# Altium footprint library WR-PHD_Socket Header.PcbLib: 273 footprints (part 12 of 18) (continued)
## 610110249221 [mm] "Socket Header, Pitch 2.54 mm, SMT, Angled, dual row, 10p" (continued)

## 610112249221 [mm] "Socket Header, Pitch 2.54 mm, SMT, Angled, dual row, 12p"
height 5.2
pads (14):
  rect 0.8x2.5 smd: 1(-6.35,6.76) 3(-3.81,6.76) 5(-1.27,6.76) 7(1.27,6.76) 9(3.81,6.76) 11(6.35,6.76)
  rect 0.8x2.1 smd: 2(-6.35,9.89) 4(-3.81,9.89) 6(-1.27,9.89) 8(1.27,9.89) 10(3.81,9.89) 12(6.35,9.89)
  round 1.4 hole 1.4 unplated: MH1(-5.08,2.75) MH2(5.08,2.75)
Top Overlay:
  lines w0.2: -8.12,-4.35 -8.12,4.35 8.12,4.35 8.12,-4.35 -8.12,-4.35
  text "11" at 7.21,6.3 h1.02
  text "12" at 7.21,9.4 h1.02
  text "2" at -7.91,9.4 h1.02
  text "1" at -7.61,6.3 h1.02
Top Designator:
  text ".Designator" at -7.498,-0.5 h1.5
Top Component Outline:
  lines w0.1: -6.67,4.25 -6.67,10.44 -6.03,10.44 -6.03,4.25 ; -6.67,7.49 -6.03,7.49 ; -4.13,4.25 -4.13,10.44 -3.49,10.44 -3.49,4.25 ; -4.13,7.49 -3.49,7.49 ; -1.59,4.25 -1.59,10.44 -0.95,10.44 -0.95,4.25 ; -1.59,7.49 -0.95,7.49 ; 0.95,4.25 0.95,10.44 1.59,10.44 1.59,4.25 ; 0.95,7.49 1.59,7.49 ; 3.49,4.25 3.49,10.44 4.13,10.44 4.13,4.25 ; 3.49,7.49 4.13,7.49 ; 6.03,4.25 6.03,10.44 6.67,10.44 6.67,4.25 ; 6.03,7.49 6.67,7.49 ; -7.87,-4.25 7.87,-4.25 7.87,4.25 -7.87,4.25 -7.87,-4.25
Top 3D Body:
  lines w0.1: -6.67,4.25 -6.67,10.44 -6.03,10.44 -6.03,4.25 ; -6.67,7.49 -6.03,7.49 ; -4.13,4.25 -4.13,10.44 -3.49,10.44 -3.49,4.25 ; -4.13,7.49 -3.49,7.49 ; -1.59,4.25 -1.59,10.44 -0.95,10.44 -0.95,4.25 ; -1.59,7.49 -0.95,7.49 ; 0.95,4.25 0.95,10.44 1.59,10.44 1.59,4.25 ; 0.95,7.49 1.59,7.49 ; 3.49,4.25 3.49,10.44 4.13,10.44 4.13,4.25 ; 3.49,7.49 4.13,7.49 ; 6.03,4.25 6.03,10.44 6.67,10.44 6.67,4.25 ; 6.03,7.49 6.67,7.49 ; -7.87,-4.25 7.87,-4.25 7.87,4.25 -7.87,4.25 -7.87,-4.25
Top Courtyard:
  lines w0.05: -0.5,0 0.5,0 ; 0,-0.5 0,0.5 ; -8.32,-4.55 8.32,-4.55 8.32,11.14 -8.32,11.14 -8.32,-4.55
3D body "610112249221.stp": height 5.03, standoff -1.27, extent -7.87,-4.25 7.87,10.44

## 610114249221 [mm] "Socket Header, Pitch 2.54 mm, SMT, Angled, dual row, 14p"
height 5.2
pads (16):
  rect 0.8x2.5 smd: 1(-7.62,6.76) 3(-5.08,6.76) 5(-2.54,6.76) 7(0,6.76) 9(2.54,6.76) 11(5.08,6.76) 13(7.62,6.76)
  rect 0.8x2.1 smd: 2(-7.62,9.89) 4(-5.08,9.89) 6(-2.54,9.89) 8(0,9.89) 10(2.54,9.89) 12(5.08,9.89) 14(7.62,9.89)
  round 1.4 hole 1.4 unplated: MH1(-6.35,2.75) MH2(6.35,2.75)
Top Overlay:
  lines w0.2: -9.39,-4.35 9.39,-4.35 9.39,4.35 -9.39,4.35 -9.39,-4.35
  text "14" at 8.48,9.4 h1.02
  text "13" at 8.48,6.3 h1.02
  text "1" at -8.88,6.3 h1.02
  text "2" at -9.18,9.4 h1.02
Top Designator:
  text ".Designator" at -7.498,-0.5 h1.5
Top Component Outline:
  lines w0.1: -7.94,4.25 -7.94,10.44 -7.3,10.44 -7.3,4.25 ; -7.94,7.49 -7.3,7.49 ; -5.4,4.25 -5.4,10.44 -4.76,10.44 -4.76,4.25 ; -5.4,7.49 -4.76,7.49 ; -2.86,4.25 -2.86,10.44 -2.22,10.44 -2.22,4.25 ; -2.86,7.49 -2.22,7.49 ; -0.32,4.25 -0.32,10.44 0.32,10.44 0.32,4.25 ; -0.32,7.49 0.32,7.49 ; 2.22,4.25 2.22,10.44 2.86,10.44 2.86,4.25 ; 2.22,7.49 2.86,7.49 ; 4.76,4.25 4.76,10.44 5.4,10.44 5.4,4.25 ; 4.76,7.49 5.4,7.49 ; 7.3,4.25 7.3,10.44 7.94,10.44 7.94,4.25 ; 7.3,7.49 7.94,7.49 ; -9.14,-4.25 9.14,-4.25 9.14,4.25 -9.14,4.25 -9.14,-4.25
Top 3D Body:
  lines w0.1: -7.94,4.25 -7.94,10.44 -7.3,10.44 -7.3,4.25 ; -7.94,7.49 -7.3,7.49 ; -5.4,4.25 -5.4,10.44 -4.76,10.44 -4.76,4.25 ; -5.4,7.49 -4.76,7.49 ; -2.86,4.25 -2.86,10.44 -2.22,10.44 -2.22,4.25 ; -2.86,7.49 -2.22,7.49 ; -0.32,4.25 -0.32,10.44 0.32,10.44 0.32,4.25 ; -0.32,7.49 0.32,7.49 ; 2.22,4.25 2.22,10.44 2.86,10.44 2.86,4.25 ; 2.22,7.49 2.86,7.49 ; 4.76,4.25 4.76,10.44 5.4,10.44 5.4,4.25 ; 4.76,7.49 5.4,7.49 ; 7.3,4.25 7.3,10.44 7.94,10.44 7.94,4.25 ; 7.3,7.49 7.94,7.49 ; -9.14,-4.25 -9.14,4.25 9.14,4.25 9.14,-4.25 -9.14,-4.25
Top Courtyard:
  lines w0.05: -0.5,0 0.5,0 ; 0,-0.5 0,0.5 ; -9.59,-4.55 -9.59,11.14 9.59,11.14 9.59,-4.55 -9.59,-4.55
3D body "610114249221.stp": height 5.03, standoff -1.27, extent -9.14,-4.25 9.14,10.44

## 610116249221 [mm] "Socket Header, Pitch 2.54 mm, SMT, Angled, dual row, 16p"
height 5.2
pads (18):
  rect 0.8x2.5 smd: 1(-8.89,6.76) 3(-6.35,6.76) 5(-3.81,6.76) 7(-1.27,6.76) 9(1.27,6.76) 11(3.81,6.76) 13(6.35,6.76) 15(8.89,6.76)
  rect 0.8x2.1 smd: 2(-8.89,9.89) 4(-6.35,9.89) 6(-3.81,9.89) 8(-1.27,9.89) 10(1.27,9.89) 12(3.81,9.89) 14(6.35,9.89) 16(8.89,9.89)
  round 1.4 hole 1.4 unplated: MH1(-7.62,2.75) MH2(7.62,2.75)
Top Overlay:
  lines w0.2: -10.66,-4.35 -10.66,4.35 10.66,4.35 10.66,-4.35 -10.66,-4.35
  text "2" at -10.45,9.4 h1.02
  text "1" at -10.15,6.3 h1.02
  text "16" at 9.75,9.4 h1.02
  text "15" at 9.75,6.3 h1.02
Top Designator:
  text ".Designator" at -7.498,-0.5 h1.5
Top Component Outline:
  lines w0.1: -9.21,4.25 -9.21,10.44 -8.57,10.44 -8.57,4.25 ; -9.21,7.49 -8.57,7.49 ; -6.67,4.25 -6.67,10.44 -6.03,10.44 -6.03,4.25 ; -6.67,7.49 -6.03,7.49 ; -4.13,4.25 -4.13,10.44 -3.49,10.44 -3.49,4.25 ; -4.13,7.49 -3.49,7.49 ; -1.59,4.25 -1.59,10.44 -0.95,10.44 -0.95,4.25 ; -1.59,7.49 -0.95,7.49 ; 0.95,4.25 0.95,10.44 1.59,10.44 1.59,4.25 ; 0.95,7.49 1.59,7.49 ; 3.49,4.25 3.49,10.44 4.13,10.44 4.13,4.25 ; 3.49,7.49 4.13,7.49 ; 6.03,4.25 6.03,10.44 6.67,10.44 6.67,4.25 ; 6.03,7.49 6.67,7.49 ; 8.57,4.25 8.57,10.44 9.21,10.44 9.21,4.25 ; 8.57,7.49 9.21,7.49 ; -10.41,-4.25 10.41,-4.25 10.41,4.25 -10.41,4.25 -10.41,-4.25
Top 3D Body:
  lines w0.1: -9.21,4.25 -9.21,10.44 -8.57,10.44 -8.57,4.25 ; -9.21,7.49 -8.57,7.49 ; -6.67,4.25 -6.67,10.44 -6.03,10.44 -6.03,4.25 ; -6.67,7.49 -6.03,7.49 ; -4.13,4.25 -4.13,10.44 -3.49,10.44 -3.49,4.25 ; -4.13,7.49 -3.49,7.49 ; -1.59,4.25 -1.59,10.44 -0.95,10.44 -0.95,4.25 ; -1.59,7.49 -0.95,7.49 ; 0.95,4.25 0.95,10.44 1.59,10.44 1.59,4.25 ; 0.95,7.49 1.59,7.49 ; 3.49,4.25 3.49,10.44 4.13,10.44 4.13,4.25 ; 3.49,7.49 4.13,7.49 ; 6.03,4.25 6.03,10.44 6.67,10.44 6.67,4.25 ; 6.03,7.49 6.67,7.49 ; 8.57,4.25 8.57,10.44 9.21,10.44 9.21,4.25 ; 8.57,7.49 9.21,7.49 ; -10.41,-4.25 10.41,-4.25 10.41,4.25 -10.41,4.25 -10.41,-4.25
Top Courtyard:
  lines w0.05: -0.5,0 0.5,0 ; 0,-0.5 0,0.5 ; -10.86,-4.55 10.86,-4.55 10.86,11.14 -10.86,11.14 -10.86,-4.55
3D body "610116249221.stp": height 5.03, standoff -1.27, extent -10.41,-4.25 10.41,10.44

## 610120249221 [mm] "Socket Header, Pitch 2.54 mm, SMT, Angled, dual row, 20p"
height 5.2
pads (22):
  rect 0.8x2.5 smd: 1(-11.43,6.76) 3(-8.89,6.76) 5(-6.35,6.76) 7(-3.81,6.76) 9(-1.27,6.76) 11(1.27,6.76) 13(3.81,6.76) 15(6.35,6.76) 17(8.89,6.76) 19(11.43,6.76)
  rect 0.8x2.1 smd: 2(-11.43,9.89) 4(-8.89,9.89) 6(-6.35,9.89) 8(-3.81,9.89) 10(-1.27,9.89) 12(1.27,9.89) 14(3.81,9.89) 16(6.35,9.89) 18(8.89,9.89) 20(11.43,9.89)
  round 1.4 hole 1.4 unplated: MH1(-10.16,2.75) MH2(10.16,2.75)
Top Overlay:
  lines w0.2: -13.2,-4.35 -13.2,4.35 13.2,4.35 13.2,-4.35 -13.2,-4.35
  text "19" at 12.29,6.3 h1.02
  text "20" at 12.29,9.4 h1.02
  text "2" at -12.99,9.4 h1.02
  text "1" at -12.69,6.3 h1.02
Top Designator:
  text ".Designator" at -7.498,-0.5 h1.5
Top Component Outline:
  lines w0.1: -11.75,4.25 -11.75,10.44 -11.11,10.44 -11.11,4.25 ; -11.75,7.49 -11.11,7.49 ; -9.21,4.25 -9.21,10.44 -8.57,10.44 -8.57,4.25 ; -9.21,7.49 -8.57,7.49 ; -6.67,4.25 -6.67,10.44 -6.03,10.44 -6.03,4.25 ; -6.67,7.49 -6.03,7.49 ; -4.13,4.25 -4.13,10.44 -3.49,10.44 -3.49,4.25 ; -4.13,7.49 -3.49,7.49 ; -1.59,4.25 -1.59,10.44 -0.95,10.44 -0.95,4.25 ; -1.59,7.49 -0.95,7.49 ; 0.95,4.25 0.95,10.44 1.59,10.44 1.59,4.25 ; 0.95,7.49 1.59,7.49 ; 3.49,4.25 3.49,10.44 4.13,10.44 4.13,4.25 ; 3.49,7.49 4.13,7.49 ; 6.03,4.25 6.03,10.44 6.67,10.44 6.67,4.25 ; 6.03,7.49 6.67,7.49 ; 8.57,4.25 8.57,10.44 9.21,10.44 9.21,4.25 ; 8.57,7.49 9.21,7.49 ; 11.11,4.25 11.11,10.44 11.75,10.44 11.75,4.25 ; 11.11,7.49 11.75,7.49 ; -12.95,-4.25 12.95,-4.25 12.95,4.25 -12.95,4.25 -12.95,-4.25
Top 3D Body:
  lines w0.1: -11.75,4.25 -11.75,10.44 -11.11,10.44 -11.11,4.25 ; -11.75,7.49 -11.11,7.49 ; -9.21,4.25 -9.21,10.44 -8.57,10.44 -8.57,4.25 ; -9.21,7.49 -8.57,7.49 ; -6.67,4.25 -6.67,10.44 -6.03,10.44 -6.03,4.25 ; -6.67,7.49 -6.03,7.49 ; -4.13,4.25 -4.13,10.44 -3.49,10.44 -3.49,4.25 ; -4.13,7.49 -3.49,7.49 ; -1.59,4.25 -1.59,10.44 -0.95,10.44 -0.95,4.25 ; -1.59,7.49 -0.95,7.49 ; 0.95,4.25 0.95,10.44 1.59,10.44 1.59,4.25 ; 0.95,7.49 1.59,7.49 ; 3.49,4.25 3.49,10.44 4.13,10.44 4.13,4.25 ; 3.49,7.49 4.13,7.49 ; 6.03,4.25 6.03,10.44 6.67,10.44 6.67,4.25 ; 6.03,7.49 6.67,7.49 ; 8.57,4.25 8.57,10.44 9.21,10.44 9.21,4.25 ; 8.57,7.49 9.21,7.49 ; 11.11,4.25 11.11,10.44 11.75,10.44 11.75,4.25 ; 11.11,7.49 11.75,7.49 ; -12.95,-4.25 12.95,-4.25 12.95,4.25 -12.95,4.25 -12.95,-4.25
Top Courtyard:
  lines w0.05: -0.5,0 0.5,0 ; 0,-0.5 0,0.5 ; -13.4,-4.55 13.4,-4.55 13.4,11.14 -13.4,11.14 -13.4,-4.55
3D body "610120249221.stp": height 5.03, standoff -1.27, extent -12.95,-4.25 12.95,10.44

## 610122249221 [mm] "Socket Header, Pitch 2.54 mm, SMT, Angled, dual row, 22p"
height 5.2
pads (24):
  rect 0.8x2.5 smd: 1(-12.7,6.76) 3(-10.16,6.76) 5(-7.62,6.76) 7(-5.08,6.76) 9(-2.54,6.76) 11(0,6.76) 13(2.54,6.76) 15(5.08,6.76) 17(7.62,6.76) 19(10.16,6.76) 21(12.7,6.76)
  rect 0.8x2.1 smd: 2(-12.7,9.89) 4(-10.16,9.89) 6(-7.62,9.89) 8(-5.08,9.89) 10(-2.54,9.89) 12(0,9.89) 14(2.54,9.89) 16(5.08,9.89) 18(7.62,9.89) 20(10.16,9.89) 22(12.7,9.89)
  round 1.4 hole 1.4 unplated: MH1(-11.43,2.75) MH2(11.43,2.75)
Top Overlay:
  lines w0.2: -14.47,-4.35 -14.47,4.35 14.47,4.35 14.47,-4.35 -14.47,-4.35
  text "2" at -14.26,9.4 h1.02
  text "1" at -13.96,6.3 h1.02
  text "22" at 13.56,9.4 h1.02
  text "21" at 13.56,6.3 h1.02
Top Designator:
  text ".Designator" at -7.498,-0.5 h1.5
Top Component Outline:
  lines w0.1: -13.02,4.25 -13.02,10.44 -12.38,10.44 -12.38,4.25 ; -13.02,7.49 -12.38,7.49 ; -10.48,4.25 -10.48,10.44 -9.84,10.44 -9.84,4.25 ; -10.48,7.49 -9.84,7.49 ; -7.94,4.25 -7.94,10.44 -7.3,10.44 -7.3,4.25 ; -7.94,7.49 -7.3,7.49 ; -5.4,4.25 -5.4,10.44 -4.76,10.44 -4.76,4.25 ; -5.4,7.49 -4.76,7.49 ; -2.86,4.25 -2.86,10.44 -2.22,10.44 -2.22,4.25 ; -2.86,7.49 -2.22,7.49 ; -0.32,4.25 -0.32,10.44 0.32,10.44 0.32,4.25 ; -0.32,7.49 0.32,7.49 ; 2.22,4.25 2.22,10.44 2.86,10.44 2.86,4.25 ; 2.22,7.49 2.86,7.49 ; 4.76,4.25 4.76,10.44 5.4,10.44 5.4,4.25 ; 4.76,7.49 5.4,7.49 ; 7.3,4.25 7.3,10.44 7.94,10.44 7.94,4.25 ; 7.3,7.49 7.94,7.49 ; 9.84,4.25 9.84,10.44 10.48,10.44 10.48,4.25 ; 9.84,7.49 10.48,7.49 ; 12.38,4.25 12.38,10.44 13.02,10.44 13.02,4.25 ; 12.38,7.49 13.02,7.49 ; -14.22,-4.25 -14.22,4.25 14.22,4.25 14.22,-4.25 -14.22,-4.25
Top 3D Body:
  lines w0.1: -13.02,4.25 -13.02,10.44 -12.38,10.44 -12.38,4.25 ; -13.02,7.49 -12.38,7.49 ; -10.48,4.25 -10.48,10.44 -9.84,10.44 -9.84,4.25 ; -10.48,7.49 -9.84,7.49 ; -7.94,4.25 -7.94,10.44 -7.3,10.44 -7.3,4.25 ; -7.94,7.49 -7.3,7.49 ; -5.4,4.25 -5.4,10.44 -4.76,10.44 -4.76,4.25 ; -5.4,7.49 -4.76,7.49 ; -2.86,4.25 -2.86,10.44 -2.22,10.44 -2.22,4.25 ; -2.86,7.49 -2.22,7.49 ; -0.32,4.25 -0.32,10.44 0.32,10.44 0.32,4.25 ; -0.32,7.49 0.32,7.49 ; 2.22,4.25 2.22,10.44 2.86,10.44 2.86,4.25 ; 2.22,7.49 2.86,7.49 ; 4.76,4.25 4.76,10.44 5.4,10.44 5.4,4.25 ; 4.76,7.49 5.4,7.49 ; 7.3,4.25 7.3,10.44 7.94,10.44 7.94,4.25 ; 7.3,7.49 7.94,7.49 ; 9.84,4.25 9.84,10.44 10.48,10.44 10.48,4.25 ; 9.84,7.49 10.48,7.49 ; 12.38,4.25 12.38,10.44 13.02,10.44 13.02,4.25 ; 12.38,7.49 13.02,7.49 ; -14.22,-4.25 14.22,-4.25 14.22,4.25 -14.22,4.25 -14.22,-4.25
Top Courtyard:
  lines w0.05: -0.5,0 0.5,0 ; 0,-0.5 0,0.5 ; -14.67,-4.55 14.67,-4.55 14.67,11.14 -14.67,11.14 -14.67,-4.55
3D body "610122249221.stp": height 5.03, standoff -1.27, extent -14.22,-4.25 14.22,10.44

## 610124249221 [mm] "Socket Header, Pitch 2.54 mm, SMT, Angled, dual row, 24p"
height 5.2
pads (26):
  rect 0.8x2.5 smd: 1(-13.97,6.76) 3(-11.43,6.76) 5(-8.89,6.76) 7(-6.35,6.76) 9(-3.81,6.76) 11(-1.27,6.76) 13(1.27,6.76) 15(3.81,6.76) 17(6.35,6.76) 19(8.89,6.76) 21(11.43,6.76) 23(13.97,6.76)
  rect 0.8x2.1 smd: 2(-13.97,9.89) 4(-11.43,9.89) 6(-8.89,9.89) 8(-6.35,9.89) 10(-3.81,9.89) 12(-1.27,9.89) 14(1.27,9.89) 16(3.81,9.89) 18(6.35,9.89) 20(8.89,9.89) 22(11.43,9.89) 24(13.97,9.89)
  round 1.4 hole 1.4 unplated: MH1(-12.7,2.75) MH2(12.7,2.75)
Top Overlay:
  lines w0.2: -15.74,-4.35 -15.74,4.35 15.74,4.35 15.74,-4.35 -15.74,-4.35
  text "23" at 14.83,6.3 h1.02
  text "24" at 14.83,9.4 h1.02
  text "2" at -15.53,9.4 h1.02
  text "1" at -15.23,6.3 h1.02
Top Designator:
  text ".Designator" at -7.498,-0.5 h1.5
Top Component Outline:
  lines w0.1: -14.29,4.25 -14.29,10.44 -13.65,10.44 -13.65,4.25 ; -14.29,7.49 -13.65,7.49 ; -11.75,4.25 -11.75,10.44 -11.11,10.44 -11.11,4.25 ; -11.75,7.49 -11.11,7.49 ; -9.21,4.25 -9.21,10.44 -8.57,10.44 -8.57,4.25 ; -9.21,7.49 -8.57,7.49 ; -6.67,4.25 -6.67,10.44 -6.03,10.44 -6.03,4.25 ; -6.67,7.49 -6.03,7.49 ; -4.13,4.25 -4.13,10.44 -3.49,10.44 -3.49,4.25 ; -4.13,7.49 -3.49,7.49 ; -1.59,4.25 -1.59,10.44 -0.95,10.44 -0.95,4.25 ; -1.59,7.49 -0.95,7.49 ; 0.95,4.25 0.95,10.44 1.59,10.44 1.59,4.25 ; 0.95,7.49 1.59,7.49 ; 3.49,4.25 3.49,10.44 4.13,10.44 4.13,4.25 ; 3.49,7.49 4.13,7.49 ; 6.03,4.25 6.03,10.44 6.67,10.44 6.67,4.25 ; 6.03,7.49 6.67,7.49 ; 8.57,4.25 8.57,10.44 9.21,10.44 9.21,4.25 ; 8.57,7.49 9.21,7.49 ; 11.11,4.25 11.11,10.44 11.75,10.44 11.75,4.25 ; 11.11,7.49 11.75,7.49 ; 13.65,4.25 13.65,10.44 14.29,10.44 14.29,4.25 ; 13.65,7.49 14.29,7.49 ; -15.49,-4.25 15.49,-4.25 15.49,4.25 -15.49,4.25 -15.49,-4.25
Top 3D Body:
  lines w0.1: -14.29,4.25 -14.29,10.44 -13.65,10.44 -13.65,4.25 ; -14.29,7.49 -13.65,7.49 ; -11.75,4.25 -11.75,10.44 -11.11,10.44 -11.11,4.25 ; -11.75,7.49 -11.11,7.49 ; -9.21,4.25 -9.21,10.44 -8.57,10.44 -8.57,4.25 ; -9.21,7.49 -8.57,7.49 ; -6.67,4.25 -6.67,10.44 -6.03,10.44 -6.03,4.25 ; -6.67,7.49 -6.03,7.49 ; -4.13,4.25 -4.13,10.44 -3.49,10.44 -3.49,4.25 ; -4.13,7.49 -3.49,7.49 ; -1.59,4.25 -1.59,10.44 -0.95,10.44 -0.95,4.25 ; -1.59,7.49 -0.95,7.49 ; 0.95,4.25 0.95,10.44 1.59,10.44 1.59,4.25 ; 0.95,7.49 1.59,7.49 ; 3.49,4.25 3.49,10.44 4.13,10.44 4.13,4.25 ; 3.49,7.49 4.13,7.49 ; 6.03,4.25 6.03,10.44 6.67,10.44 6.67,4.25 ; 6.03,7.49 6.67,7.49 ; 8.57,4.25 8.57,10.44 9.21,10.44 9.21,4.25 ; 8.57,7.49 9.21,7.49 ; 11.11,4.25 11.11,10.44 11.75,10.44 11.75,4.25 ; 11.11,7.49 11.75,7.49 ; 13.65,4.25 13.65,10.44 14.29,10.44 14.29,4.25 ; 13.65,7.49 14.29,7.49 ; -15.49,-4.25 15.49,-4.25 15.49,4.25 -15.49,4.25 -15.49,-4.25
Top Courtyard:
  lines w0.05: -0.5,0 0.5,0 ; 0,-0.5 0,0.5 ; -15.94,-4.55 15.94,-4.55 15.94,11.14 -15.94,11.14 -15.94,-4.55
3D body "610124249221.stp": height 5.03, standoff -1.27, extent -15.49,-4.25 15.49,10.44

## 610126249221 [mm] "Socket Header, Pitch 2.54 mm, SMT, Angled, dual row, 26p"
height 5.2
pads (28):
  rect 0.8x2.5 smd: 1(-15.24,6.76) 3(-12.7,6.76) 5(-10.16,6.76) 7(-7.62,6.76) 9(-5.08,6.76) 11(-2.54,6.76) 13(0,6.76) 15(2.54,6.76) 17(5.08,6.76) 19(7.62,6.76) 21(10.16,6.76) 23(12.7,6.76) 25(15.24,6.76)
  rect 0.8x2.1 smd: 2(-15.24,9.89) 4(-12.7,9.89) 6(-10.16,9.89) 8(-7.62,9.89) 10(-5.08,9.89) 12(-2.54,9.89) 14(0,9.89) 16(2.54,9.89) 18(5.08,9.89) 20(7.62,9.89) 22(10.16,9.89) 24(12.7,9.89) 26(15.24,9.89)
  round 1.4 hole 1.4 unplated: MH1(-13.97,2.75) MH2(13.97,2.75)
Top Overlay:
  lines w0.2: -17.01,-4.35 17.01,-4.35 17.01,4.35 -17.01,4.35 -17.01,-4.35
  text "1" at -16.5,6.3 h1.02
  text "2" at -16.8,9.4 h1.02
  text "26" at 16.1,9.4 h1.02
  text "25" at 16.1,6.3 h1.02
Top Designator:
  text ".Designator" at -7.498,-0.5 h1.5
Top Component Outline:
  lines w0.1: -15.56,4.25 -15.56,10.44 -14.92,10.44 -14.92,4.25 ; -15.56,7.49 -14.92,7.49 ; -13.02,4.25 -13.02,10.44 -12.38,10.44 -12.38,4.25 ; -13.02,7.49 -12.38,7.49 ; -10.48,4.25 -10.48,10.44 -9.84,10.44 -9.84,4.25 ; -10.48,7.49 -9.84,7.49 ; -7.94,4.25 -7.94,10.44 -7.3,10.44 -7.3,4.25 ; -7.94,7.49 -7.3,7.49 ; -5.4,4.25 -5.4,10.44 -4.76,10.44 -4.76,4.25 ; -5.4,7.49 -4.76,7.49 ; -2.86,4.25 -2.86,10.44 -2.22,10.44 -2.22,4.25 ; -2.86,7.49 -2.22,7.49 ; -0.32,4.25 -0.32,10.44 0.32,10.44 0.32,4.25 ; -0.32,7.49 0.32,7.49 ; 2.22,4.25 2.22,10.44 2.86,10.44 2.86,4.25 ; 2.22,7.49 2.86,7.49 ; 4.76,4.25 4.76,10.44 5.4,10.44 5.4,4.25 ; 4.76,7.49 5.4,7.49 ; 7.3,4.25 7.3,10.44 7.94,10.44 7.94,4.25 ; 7.3,7.49 7.94,7.49 ; 9.84,4.25 9.84,10.44 10.48,10.44 10.48,4.25 ; 9.84,7.49 10.48,7.49 ; 12.38,4.25 12.38,10.44 13.02,10.44 13.02,4.25 ; 12.38,7.49 13.02,7.49 ; 14.92,4.25 14.92,10.44 15.56,10.44 15.56,4.25 ; 14.92,7.49 15.56,7.49 ; -16.76,-4.25 -16.76,4.25 16.76,4.25 16.76,-4.25 -16.76,-4.25
Top 3D Body:
  lines w0.1: -15.56,4.25 -15.56,10.44 -14.92,10.44 -14.92,4.25 ; -15.56,7.49 -14.92,7.49 ; -13.02,4.25 -13.02,10.44 -12.38,10.44 -12.38,4.25 ; -13.02,7.49 -12.38,7.49 ; -10.48,4.25 -10.48,10.44 -9.84,10.44 -9.84,4.25 ; -10.48,7.49 -9.84,7.49 ; -7.94,4.25 -7.94,10.44 -7.3,10.44 -7.3,4.25 ; -7.94,7.49 -7.3,7.49 ; -5.4,4.25 -5.4,10.44 -4.76,10.44 -4.76,4.25 ; -5.4,7.49 -4.76,7.49 ; -2.86,4.25 -2.86,10.44 -2.22,10.44 -2.22,4.25 ; -2.86,7.49 -2.22,7.49 ; -0.32,4.25 -0.32,10.44 0.32,10.44 0.32,4.25 ; -0.32,7.49 0.32,7.49 ; 2.22,4.25 2.22,10.44 2.86,10.44 2.86,4.25 ; 2.22,7.49 2.86,7.49 ; 4.76,4.25 4.76,10.44 5.4,10.44 5.4,4.25 ; 4.76,7.49 5.4,7.49 ; 7.3,4.25 7.3,10.44 7.94,10.44 7.94,4.25 ; 7.3,7.49 7.94,7.49 ; 9.84,4.25 9.84,10.44 10.48,10.44 10.48,4.25 ; 9.84,7.49 10.48,7.49 ; 12.38,4.25 12.38,10.44 13.02,10.44 13.02,4.25 ; 12.38,7.49 13.02,7.49 ; 14.92,4.25 14.92,10.44 15.56,10.44 15.56,4.25 ; 14.92,7.49 15.56,7.49 ; -16.76,-4.25 -16.76,4.25 16.76,4.25 16.76,-4.25 -16.76,-4.25
Top Courtyard:
  lines w0.05: -0.5,0 0.5,0 ; 0,-0.5 0,0.5 ; -17.21,-4.55 -17.21,11.14 17.21,11.14 17.21,-4.55 -17.21,-4.55
3D body "610126249221.stp": height 5.03, standoff -1.27, extent -16.76,-4.25 16.76,10.44

## 610304243021 [mm] "Socket Header, Pitch 2.54 mm, SMT, Vertical, dual row, 4p"
height 3.7
pads (8):
  rect 0.9x1.8 smd: 1(-1.27,-3.2) 2(-1.27,3.2) 3(1.27,-3.2) 4(1.27,3.2)
  round 1.1 hole 1.1 unplated: MH1(-1.27,-1.27) MH2(-1.27,1.27) MH3(1.27,-1.27) MH4(1.27,1.27)
Top Overlay:
  lines w0.2: -2,-2.575 -2.69,-2.575 -2.69,2.575 -2,2.575 ; 2,-2.575 2.69,-2.575 2.69,2.575 2,2.575
  text "1" at -2.6,-4 h1.02
  text "3" at 2.2,-4 h1.02
  text "4" at 2.2,3 h1.02
  text "2" at -2.9,3 h1.02
Top Designator:
  text ".Designator" at -7.498,-0.5 h1.5
Top Component Outline:
  lines w0.1: -1.52,-2.5 -1.52,-3.6 -1.02,-3.6 -1.02,-2.5 ; -1.52,2.5 -1.52,3.6 -1.02,3.6 -1.02,2.5 ; 1.02,-2.5 1.02,-3.6 1.52,-3.6 1.52,-2.5 ; 1.02,2.5 1.02,3.6 1.52,3.6 1.52,2.5 ; -2.54,-2.5 -2.54,2.5 2.54,2.5 2.54,-2.5 -2.54,-2.5
Top 3D Body:
  lines w0.1: -1.52,-2.5 -1.52,-3.6 -1.02,-3.6 -1.02,-2.5 ; -1.52,2.5 -1.52,3.6 -1.02,3.6 -1.02,2.5 ; 1.02,-2.5 1.02,-3.6 1.52,-3.6 1.52,-2.5 ; 1.02,2.5 1.02,3.6 1.52,3.6 1.52,2.5 ; -2.54,-2.5 2.54,-2.5 2.54,2.5 -2.54,2.5 -2.54,-2.5
Top Courtyard:
  lines w0.05: -0.5,0 0.5,0 ; 0,-0.5 0,0.5 ; -2.89,-4.3 -2.89,4.3 2.89,4.3 2.89,-4.3 -2.89,-4.3
3D body "610304243021.stp": height 4.69, standoff 0, extent -2.54,-3.601 2.54,3.601

## 610306243021 [mm] "Socket Header, Pitch 2.54 mm, SMT, Vertical, dual row, 6p"
height 3.7
pads (12):
  rect 0.9x1.8 smd: 1(-2.54,-3.2) 2(-2.54,3.2) 3(0,-3.2) 4(0,3.2) 5(2.54,-3.2) 6(2.54,3.2)
  round 1.1 hole 1.1 unplated: MH1(-2.54,-1.27) MH2(-2.54,1.27) MH3(0,-1.27) MH4(0,1.27) MH5(2.54,-1.27) MH6(2.54,1.27)
Top Overlay:
  lines w0.2: -3.27,-2.575 -3.96,-2.575 -3.96,2.575 -3.27,2.575 ; 3.27,-2.575 3.96,-2.575 3.96,2.575 3.27,2.575
  text "5" at 3.47,-4 h1.02
  text "6" at 3.47,3 h1.02
  text "1" at -3.87,-4 h1.02
  text "2" at -4.17,3 h1.02
Top Designator:
  text ".Designator" at -7.498,-0.5 h1.5
Top Component Outline:
  lines w0.1: -2.79,-2.5 -2.79,-3.6 -2.29,-3.6 -2.29,-2.5 ; -2.79,2.5 -2.79,3.6 -2.29,3.6 -2.29,2.5 ; -0.25,-2.5 -0.25,-3.6 0.25,-3.6 0.25,-2.5 ; -0.25,2.5 -0.25,3.6 0.25,3.6 0.25,2.5 ; 2.29,-2.5 2.29,-3.6 2.79,-3.6 2.79,-2.5 ; 2.29,2.5 2.29,3.6 2.79,3.6 2.79,2.5 ; -3.81,-2.5 3.81,-2.5 3.81,2.5 -3.81,2.5 -3.81,-2.5
Top 3D Body:
  lines w0.1: -2.79,-2.5 -2.79,-3.6 -2.29,-3.6 -2.29,-2.5 ; -2.79,2.5 -2.79,3.6 -2.29,3.6 -2.29,2.5 ; -0.25,-2.5 -0.25,-3.6 0.25,-3.6 0.25,-2.5 ; -0.25,2.5 -0.25,3.6 0.25,3.6 0.25,2.5 ; 2.29,-2.5 2.29,-3.6 2.79,-3.6 2.79,-2.5 ; 2.29,2.5 2.29,3.6 2.79,3.6 2.79,2.5 ; -3.81,-2.5 3.81,-2.5 3.81,2.5 -3.81,2.5 -3.81,-2.5
Top Courtyard:
  lines w0.05: -0.5,0 0.5,0 ; 0,-0.5 0,0.5 ; -4.16,-4.3 -4.16,4.3 4.16,4.3 4.16,-4.3 -4.16,-4.3
3D body "610306243021.stp": height 4.68, standoff 0, extent -3.81,-3.601 3.81,3.601

## 610308243021 [mm] "Socket Header, Pitch 2.54 mm, SMT, Vertical, dual row, 8p"
height 3.7
pads (16):
  rect 0.9x1.8 smd: 1(-3.81,-3.2) 2(-3.81,3.2) 3(-1.27,-3.2) 4(-1.27,3.2) 5(1.27,-3.2) 6(1.27,3.2) 7(3.81,-3.2) 8(3.81,3.2)
  round 1.1 hole 1.1 unplated: MH1(-3.81,-1.27) MH2(-3.81,1.27) MH3(-1.27,-1.27) MH4(-1.27,1.27) MH5(1.27,-1.27) MH6(1.27,1.27) MH7(3.81,-1.27) MH8(3.81,1.27)
Top Overlay:
  lines w0.2: -4.54,-2.575 -5.23,-2.575 -5.23,2.575 -4.54,2.575 ; 4.54,-2.575 5.23,-2.575 5.23,2.575 4.54,2.575
  text "2" at -5.44,3 h1.02
  text "1" at -5.14,-4 h1.02
  text "8" at 4.74,3 h1.02
  text "7" at 4.74,-4 h1.02
Top Designator:
  text ".Designator" at -7.498,-0.5 h1.5
Top Component Outline:
  lines w0.1: -4.06,-2.5 -4.06,-3.6 -3.56,-3.6 -3.56,-2.5 ; -4.06,2.5 -4.06,3.6 -3.56,3.6 -3.56,2.5 ; -1.52,-2.5 -1.52,-3.6 -1.02,-3.6 -1.02,-2.5 ; -1.52,2.5 -1.52,3.6 -1.02,3.6 -1.02,2.5 ; 1.02,-2.5 1.02,-3.6 1.52,-3.6 1.52,-2.5 ; 1.02,2.5 1.02,3.6 1.52,3.6 1.52,2.5 ; 3.56,-2.5 3.56,-3.6 4.06,-3.6 4.06,-2.5 ; 3.56,2.5 3.56,3.6 4.06,3.6 4.06,2.5 ; -5.08,-2.5 5.08,-2.5 5.08,2.5 -5.08,2.5 -5.08,-2.5
Top 3D Body:
  lines w0.1: -4.06,-2.5 -4.06,-3.6 -3.56,-3.6 -3.56,-2.5 ; -4.06,2.5 -4.06,3.6 -3.56,3.6 -3.56,2.5 ; -1.52,-2.5 -1.52,-3.6 -1.02,-3.6 -1.02,-2.5 ; -1.52,2.5 -1.52,3.6 -1.02,3.6 -1.02,2.5 ; 1.02,-2.5 1.02,-3.6 1.52,-3.6 1.52,-2.5 ; 1.02,2.5 1.02,3.6 1.52,3.6 1.52,2.5 ; 3.56,-2.5 3.56,-3.6 4.06,-3.6 4.06,-2.5 ; 3.56,2.5 3.56,3.6 4.06,3.6 4.06,2.5 ; -5.08,-2.5 -5.08,2.5 5.08,2.5 5.08,-2.5 -5.08,-2.5
Top Courtyard:
  lines w0.05: -0.5,0 0.5,0 ; 0,-0.5 0,0.5 ; -5.43,-4.3 5.43,-4.3 5.43,4.3 -5.43,4.3 -5.43,-4.3
3D body "610308243021.stp": height 4.68, standoff 0, extent -5.08,-3.601 5.08,3.601